# Altium footprint library Roket_Library.PcbLib: 45 footprints (part 2 of 3)
Each footprint in its own frame and in the unit in brackets; x right, y up, seen from the top. Pads: shape width x height; smd on the part's side, far side on the other; paste and mask are expansions set on the pad; w line width, h text height; cw(c..) or ccw(c..) is an arc to the next point about the centre after c.
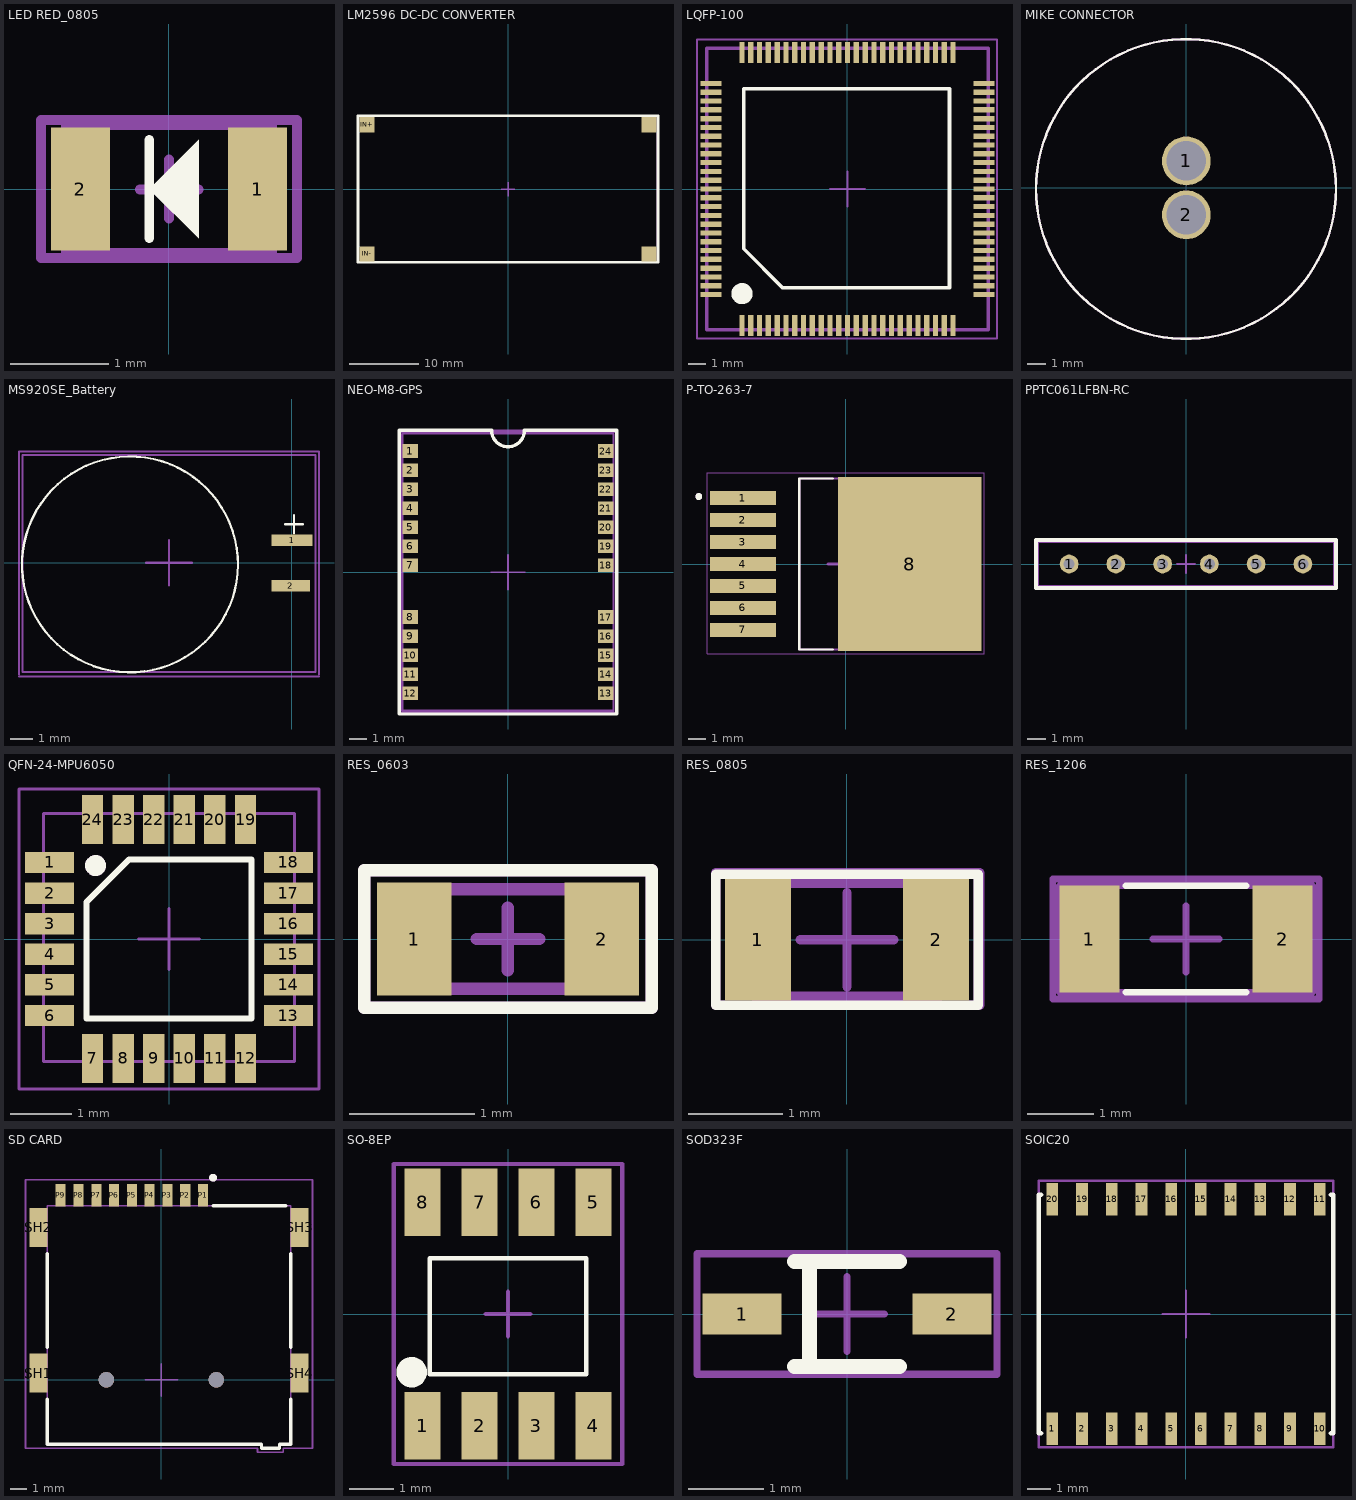
[diagram p1: the footprints below, top view; thin cyan lines are the x and y axes]

## LED RED_0805 [mm]
pads (2):
  rect 0.6x1.25 smd mask+0.05: 1(0.9,0) 2(-0.9,0)
Top Overlay:
  region: 0.3,0.5 0.3,-0.5 -0.2,0
  lines w0.1: -0.2,-0.5 -0.2,0.5
Top 3D Body:
  lines w0.1: -1.05,-0.65 1.05,-0.65 1.05,0.65 -1.05,0.65 -1.05,-0.65
Top Component Center:
  lines w0.1: -0.297,-0.005 0.303,-0.005 ; 0,-0.3 0,0.3 ; -1.3,-0.7 1.3,-0.7 1.3,0.7 -1.3,0.7 -1.3,-0.7
Top Designator:
  lines w0.1: -1.3,-0.7 -1.3,0.7 ; -1.3,-0.7 1.3,-0.7 ; -1.3,-0.7 -1.3,0.7 ; -1.3,-0.7 1.3,-0.7 ; -1.3,0.7 1.3,0.7 ; -1.3,0.7 1.3,0.7 ; 1.3,-0.7 1.3,0.7 ; 1.3,-0.7 1.3,0.7
  text "'.Designator'" at -1.6,-0.8 h0.7
3D body "everlight-17-21-0805LED-red.step": height 1.12, standoff 0.01, extent -1,-0.625 1,0.625

## LM2596 DC-DC CONVERTER [mm]
pads (4):
  rect 2.2x2.2 smd mask+0.05: IN+(-20.3,9.3) IN-(-20.3,-9.3) OUT+(20.3,9.3) OUT-(20.3,-9.3)
Top Overlay:
  lines w0.4: -21.6,-10.5 21.6,-10.5 21.6,10.6 -21.6,10.6 -21.6,-10.5
Top 3D Body:
  lines w0.2: -21.6,-10.5 21.5,-10.5 21.5,10.6 -21.6,10.6 -21.6,-10.5
Top Component Center:
  lines w0.2: -1,0 1,0 ; 0,-1 0,1 ; -21.6,-10.5 21.5,-10.5 21.5,10.6 -21.6,10.6 -21.6,-10.5
Top Designator:
  lines w0.2: -21.6,-10.5 -21.6,10.6 21.5,10.6 21.5,-10.5 -21.6,-10.5
  text "'.Designator'" at -10.8,-1.7 h2
3D body "lm2596.stp": height 13.4, standoff 0.05, extent -21.5,-10.5 21.5,10.5

## LQFP-100 [mm]
pads (100):
  rect 0.3x1.2 smd mask+0.05: 1(-5.995,-7.75) 2(-5.495,-7.75) 3(-4.995,-7.75) 4(-4.495,-7.75) 5(-3.995,-7.75) 6(-3.495,-7.75) 7(-2.995,-7.75) 8(-2.495,-7.75) 9(-1.995,-7.75) 10(-1.495,-7.75) 11(-0.995,-7.75) 12(-0.495,-7.75) 13(0.005,-7.75) 14(0.505,-7.75) 15(1.005,-7.75) 16(1.505,-7.75) 17(2.005,-7.75) 18(2.505,-7.75) 19(3.005,-7.75) 20(3.505,-7.75) 21(4.005,-7.75) 22(4.505,-7.75) 23(5.005,-7.75) 24(5.505,-7.75) 25(6.005,-7.75) 51(6.005,7.75) 52(5.505,7.75) 53(5.005,7.75) 54(4.505,7.75) 55(4.005,7.75) 56(3.505,7.75) 57(3.005,7.75) 58(2.505,7.75) 59(2.005,7.75) 60(1.505,7.75) 61(1.005,7.75) 62(0.505,7.75) 63(0.005,7.75) 64(-0.495,7.75) 65(-0.995,7.75) 66(-1.495,7.75) 67(-1.995,7.75) 68(-2.495,7.75) 69(-2.995,7.75) 70(-3.495,7.75) 71(-3.995,7.75) 72(-4.495,7.75) 73(-4.995,7.75) 74(-5.495,7.75) 75(-5.995,7.75)
  rect 1.2x0.3 smd mask+0.05: 26(7.755,-6) 27(7.755,-5.5) 28(7.755,-5) 29(7.755,-4.5) 30(7.755,-4) 31(7.755,-3.5) 32(7.755,-3) 33(7.755,-2.5) 34(7.755,-2) 35(7.755,-1.5) 36(7.755,-1) 37(7.755,-0.5) 38(7.755,0) 39(7.755,0.5) 40(7.755,1) 41(7.755,1.5) 42(7.755,2) 43(7.755,2.5) 44(7.755,3) 45(7.755,3.5) 46(7.755,4) 47(7.755,4.5) 48(7.755,5) 49(7.755,5.5) 50(7.755,6) 76(-7.755,6) 77(-7.755,5.5) 78(-7.755,5) 79(-7.755,4.5) 80(-7.755,4) 81(-7.755,3.5) 82(-7.755,3) 83(-7.755,2.5) 84(-7.755,2) 85(-7.755,1.5) 86(-7.755,1) 87(-7.755,0.5) 88(-7.755,0) 89(-7.755,-0.5) 90(-7.755,-1) 91(-7.755,-1.5) 92(-7.755,-2) 93(-7.755,-2.5) 94(-7.755,-3) 95(-7.755,-3.5) 96(-7.755,-4) 97(-7.755,-4.5) 98(-7.755,-5) 99(-7.755,-5.5) 100(-7.755,-6)
Top Overlay:
  circle w0.8: c-5.995,-5.95 r0.2
  lines w0.2: -5.9,-3.4 -3.7,-5.6 5.8,-5.6 5.8,5.7 -5.9,5.7 -5.9,-3.4
Top 3D Body:
  lines w0.2: -8,-8 8,-8 8,8 -8,8 -8,-8
Top Component Center:
  lines w0.1: -1,0 1,0 ; 0,-1 0,1 ; -8.55,-8.5 -8.55,6.15 -8.55,8.5 8.5,8.5 8.5,-8.5 -8.55,-8.5
Top Designator:
  lines w0.1: -8.55,-8.5 -8.55,6.15 -8.55,8.5 8.5,8.5 8.5,-8.5 -8.55,-8.5
  text "'.Designator'" at -8.7,-1.8 h2
3D body "STM32F407VGT6.STEP": height 1.6, standoff 0, extent -7.995,-8 8.005,8

## MIKE CONNECTOR [mm]
pads (2):
  round 2.6 hole 2.1 mask+0.05: 1(0,1.438) 2(0,-1.438)
Top Overlay:
  circle w0.127: c-0.017,-0.062 r8
Top 3D Body:
  circle w0.127: c-0.017,-0.062 r8
Top Designator (Mech15):
  circle w0.05: c-0.017,-0.062 r8
3D body "17282-2PG-3ES--3DModel-STEP-1.STEP": height 18.14, standoff -3.14, extent -7.955,-9.054 7.92,9.13

## MS920SE_Battery [mm]
pads (2):
  rect 1.8x0.5 smd mask+0.05: 1(0.013,1)
  rect 1.7x0.5 smd mask+0.05: 2(-0.037,-1)
Top Overlay:
  lines w0.1: -2.604,1.411 ccw(c-7.117,-0.069) -2.6,1.4 ; -0.3,1.7 0.5,1.7 ; 0.1,1.3 0.1,2.1
Top 3D Body:
  lines w0.1: -11.85,-4.8 1.05,-4.8 1.05,4.75 -11.85,4.75 -11.85,-4.8
Top Component Center:
  lines w0.1: -12,-5 1.2,-5 ; -12,-4.9 -12,4.9 1.2,4.9 1.2,-0.5 1.2,-4.9 ; -6.4,0 -4.4,0 ; -5.4,-1 -5.4,1
Top Designator:
  lines w0.1: -12,-5 1.2,-5 ; -12,-4.9 -12,4.9 1.2,4.9 1.2,-0.5 1.2,-4.9
  text "'.Designator'" at -12.5,-1.5 h1.5
3D body "MS920SE-FL27E--3DModel-STEP-56544.STEP": height 2.86, standoff 0.01, extent -11.8,-4.8 1,4.7

## NEO-M8-GPS [mm]
pads (24):
  rect 0.9x0.8 smd mask+0.05: 1(-5.65,7) 2(-5.65,5.9) 3(-5.65,4.8) 4(-5.65,3.7) 5(-5.65,2.6) 6(-5.65,1.5) 7(-5.65,0.4) 8(-5.65,-2.6) 9(-5.65,-3.7) 10(-5.65,-4.8) 11(-5.65,-5.9) 12(-5.65,-7) 13(5.65,-7) 14(5.65,-5.9) 15(5.65,-4.8) 16(5.65,-3.7) 17(5.65,-2.6) 18(5.65,0.4) 19(5.65,1.5) 20(5.65,2.6) 21(5.65,3.7) 22(5.65,4.8) 23(5.65,5.9) 24(5.65,7)
Top Overlay:
  lines w0.2: -6.3,-8.2 6.3,-8.2 6.3,8.2 0.949,8.2 cw(c0,8.2) -0.949,8.2 -6.3,8.2 -6.3,-8.2
Top 3D Body:
  lines w0.1: -6.1,-8 -6.1,8 6.1,8 6.1,-8 -6.1,-8
Top Component Center:
  lines w0.1: -1,0 1,0 ; 0,-1 0,1 ; -6.3,-8.2 -6.3,8.2 6.3,8.2 6.3,-8.2 -6.3,-8.2
Top Designator:
  lines w0.1: -6.2,-8.1 6.3,-8.1 6.3,8.1 -6.2,8.1 -6.2,-8.1
  text "'.Designator'" at -8.2,-1.6 h2
3D body "User Library-NEO-M8Q.step": height 2.39, standoff 0.01, extent -6.1,-8 6.1,8

## P-TO-263-7 [mm]
pads (8):
  rect 3.81x0.8 smd: 1(-5.95,3.81) 2(-5.95,2.54) 3(-5.95,1.27) 4(-5.95,0) 5(-5.95,-1.27) 6(-5.95,-2.54) 7(-5.95,-3.81)
  rect 8.29x10.07 smd paste-4.36: 8(3.71,0)
Top Overlay:
  circle w0.2: c-8.5,3.9 r0.1
  lines w0.127: -0.749,-4.95 -2.69,-4.95 -2.69,4.95 -0.749,4.95
Top Paste:
  region: 1.775,3.365 0.125,3.365 0.125,4.715 1.775,4.715
  region: 1.775,1.345 0.125,1.345 0.125,2.695 1.775,2.695
  region: 1.775,-0.675 0.125,-0.675 0.125,0.675 1.775,0.675
  region: 1.775,-2.695 0.125,-2.695 0.125,-1.345 1.775,-1.345
  region: 1.775,-4.715 0.125,-4.715 0.125,-3.365 1.775,-3.365
  region: 7.295,-4.715 5.645,-4.715 5.645,-3.365 7.295,-3.365
  region: 7.295,-2.695 5.645,-2.695 5.645,-1.345 7.295,-1.345
  region: 7.295,-0.675 5.645,-0.675 5.645,0.675 7.295,0.675
  region: 7.295,1.345 5.645,1.345 5.645,2.695 7.295,2.695
  region: 7.295,3.365 5.645,3.365 5.645,4.715 7.295,4.715
  region: 4.535,-4.715 2.885,-4.715 2.885,-3.365 4.535,-3.365
  region: 4.535,-2.695 2.885,-2.695 2.885,-1.345 4.535,-1.345
  region: 4.535,3.365 2.885,3.365 2.885,4.715 4.535,4.715
  region: 4.535,1.345 2.885,1.345 2.885,2.695 4.535,2.695
Top Component Center:
  lines w0.05: -8,-5.2 -2.94,-5.2 8,-5.2 8,5.29 -2.94,5.29 -8,5.29 -8,-5.2
  lines w0.2: -1,0 1,0 ; 0,-1 0,1
Top Designator:
  lines w0.05: -8,-5.2 -8,5.29 -2.94,5.29 8,5.29 8,-5.2 -2.94,-5.2 -8,-5.2
  text "'.Designator'" at -6.1,-0.9 h1
Mechanical 13:
  circle w0.2: c-8.5,3.9 r0.1
  lines w0.127: -2.69,-4.95 -2.69,4.95 6.71,4.95 6.71,-4.95 -2.69,-4.95
3D body "step_temp.STEP": height 4.4, standoff 0, extent -7.45,-4.95 7.45,4.95

## PPTC061LFBN-RC [mm]
pads (6):
  round 1.02 hole 0.6 mask+0.05: 1(-6.35,0) 2(-3.81,0) 3(-1.27,0) 4(1.27,0) 5(3.81,0) 6(6.35,0)
Top Overlay:
  lines w0.2: -8.15,-1.3 -8.15,1.3 8.15,1.3 8.15,-1.3 -8.15,-1.3
Top 3D Body:
  lines w0.1: -8.05,-1.2 -8.05,1.2 8.05,1.2 8.05,-1.2 -8.05,-1.2
Top Component Center:
  lines w0.1: -0.5,0 0.5,0 ; 0,-0.5 0,0.5 ; -8.1,-1.3 8.1,-1.3 8.1,1.3 -8.1,1.3 -8.1,-1.3
Top Designator:
  lines w0.1: -8.1,-1.3 8.1,-1.3 8.1,1.3 -8.1,1.3 -8.1,-1.3
  text "'.Designator'" at -5.8,-0.9 h1
3D body "HEADER6PFEM.stp": height 8.3, standoff -3.2, extent -8.05,-1.2 8.05,1.2

## QFN-24-MPU6050 [mm]
pads (24):
  rect 0.8x0.35 smd mask+0.05: 1(-1.95,1.25) 2(-1.95,0.75) 3(-1.95,0.25) 4(-1.95,-0.25) 5(-1.95,-0.75) 6(-1.95,-1.25) 13(1.95,-1.25) 14(1.95,-0.75) 15(1.95,-0.25) 16(1.95,0.25) 17(1.95,0.75) 18(1.95,1.25)
  rect 0.35x0.8 smd mask+0.05: 7(-1.25,-1.95) 8(-0.75,-1.95) 9(-0.25,-1.95) 10(0.25,-1.95) 11(0.75,-1.95) 12(1.25,-1.95) 19(1.25,1.95) 20(0.75,1.95) 21(0.25,1.95) 22(-0.25,1.95) 23(-0.75,1.95) 24(-1.25,1.95)
Top Overlay:
  circle w0.2: c-1.2,1.2 r0.071
  lines w0.1: -1.35,-1.3 -1.35,0.6 -0.65,1.3 1.35,1.3 1.35,0 1.35,-1.3 -1.35,-1.3
Top 3D Body:
  circle w0.2: c-1.2,1.2 r0.071
  lines w0.05: -2.05,-2 2.05,-2 2.05,2.05 -2.05,2.05 -2.05,-2
Top Component Center:
  lines w0.05: -0.5,0 0.5,0 ; 0,-0.5 0,0.5 ; -2.45,-2.45 2.45,-2.45 2.45,2.45 -2.45,2.45 -2.45,-2.45
Top Designator:
  lines w0.05: -2.45,-2.45 -2.45,2.45 2.45,2.45 2.45,-2.45 -2.45,-2.45
  text "'.Designator'" at -2.05,-0.45 h0.5
3D body "User Library-mpu-6050_qfn-24.step": height 0.91, standoff 0.01, extent -2.02,-2 2.02,2.04

## RES_0603 [mm]
pads (2):
  rect 0.6x0.9 smd mask+0.05: 1(-0.75,0) 2(0.75,0)
Top Overlay:
  lines w0.1: -1.15,-0.55 1.15,-0.55 1.15,0.55 -1.15,0.55 -1.15,-0.55
Top 3D Body:
  lines w0.1: -0.8,-0.4 -0.8,0.4 0.8,0.4 0.8,-0.4 -0.8,-0.4
Top Component Center:
  lines w0.1: -0.25,0 0.25,0 ; 0,-0.25 0,0.25 ; -1.15,-0.55 -1.15,0.55 1.15,0.55 1.15,-0.55 -1.15,-0.55
Top Designator:
  lines w0.1: -1.15,-0.55 1.15,-0.55 1.15,0.55 -1.15,0.55 -1.15,-0.55
  text "'.Designator'" at -1.15,-0.55 h0.5
3D body "RESC0603 v2.step": height 0.45, standoff 0, extent -0.8,-0.4 0.8,0.4

## RES_0805 [mm]
pads (2):
  rect 0.7x1.3 smd mask+0.05: 1(-0.95,0) 2(0.95,0)
Top Overlay:
  lines w0.1: -1.4,-0.7 1.4,-0.7 1.4,0.7 -1.4,0.7 -1.4,-0.7
Top 3D Body:
  lines w0.1: -1,-0.6 1,-0.6 1,0.6 -1,0.6 -1,-0.6
Top Component Center:
  lines w0.1: -0.5,0 0.5,0 ; 0,-0.5 0,0.5 ; -1.4,-0.7 1.416,-0.7 1.416,0.716 -1.4,0.716 -1.4,-0.7
Top Designator:
  lines w0.1: -1.4,-0.7 -1.4,0.7 1.4,0.7 1.4,-0.7 -1.4,-0.7
  text "'.Designator'" at -1.4,-0.4 h0.5
3D body "RESC0805 v1.step": height 0.45, standoff 0, extent -1,-0.6 1,0.6

## RES_1206 [mm]
pads (2):
  rect 0.9x1.6 smd mask+0.05: 1(-1.45,0) 2(1.45,0)
Top Overlay:
  lines w0.1: -0.9,-0.8 0.9,-0.8 ; -0.9,0.8 0.9,0.8
Top 3D Body:
  lines w0.1: -1.6,-0.8 1.6,-0.8 1.6,0.8 -1.6,0.8 -1.6,-0.8
Top Component Center:
  lines w0.1: -0.5,0 0.5,0 ; 0,-0.5 0,0.5 ; -2,-0.9 -2,0.9 2,0.9 2,-0.9 -2,-0.9
Top Designator:
  lines w0.1: -1.9,-0.8 1.9,-0.8 1.9,0.8 -1.9,0.8 -1.9,-0.8
  text "'.Designator'" at -2,-0.5 h0.5
3D body "RESC1206 v1.step": height 0.55, standoff 0, extent -1.6,-0.8 1.6,0.8

## SD CARD [mm]
pads (15):
  rect 0.62x1.4 smd mask+0.05: P1(2.58,11.42) P2(1.48,11.42) P3(0.38,11.42) P4(-0.72,11.42) P5(-1.82,11.42) P6(-2.92,11.42) P7(-4.02,11.42) P8(-5.12,11.42) P9(-6.22,11.42)
  rect 1.1x2.4 smd mask+0.05: SH1(-7.6,0.42) SH2(-7.6,9.42) SH3(8.55,9.42) SH4(8.55,0.42)
  round 0.95 hole 0.95 unplated: ""(-3.4,0) ""(3.4,0)
Top Overlay:
  circle w0.24: c3.2,12.5 r0.12
  lines w0.2: -7.05,-1.2 -7.05,-3.98 6.2,-3.98 6.2,-4.23 7.3,-4.23 7.3,-3.98 8,-3.98 8,-1.2 ; -7.05,2 -7.05,7.8 ; 3.2,10.77 7.7,10.77 ; 8,2 8,7.8
Top Component Center:
  lines w0.1: -1,0 1,0 ; 0,-1 0,1 ; -8.4,-4.23 -8.4,12.37 9.35,12.37 9.35,-4.23 7.55,-4.23 7.55,-4.48 5.95,-4.48 5.95,-4.23 -8.4,-4.23
Top Designator:
  lines w0.1: -8.4,-4.23 -8.4,12.37 9.35,12.37 9.35,-4.23 7.55,-4.23 7.55,-4.48 5.95,-4.48 5.95,-4.23 -8.4,-4.23
  text "'.Designator'" at -3.2,-0.5 h0.6
Mechanical 13:
  circle w0.24: c3.2,12.5 r0.12
  lines w0.1: -7.05,-3.98 6.2,-3.98 6.2,-4.23 7.3,-4.23 7.3,-3.98 8,-3.98 8,10.77 -7.05,10.77 -7.05,-3.98
3D body "MEM2075-00-140-01-A--3DModel-STEP-56544.STEP": height 1.46, standoff -0.59, extent -7.74,-3.869 8.7,11.981

## SO-8EP [mm]
pads (8):
  rect 0.802x1.505 smd mask+0.05: 1(-1.905,-2.497) 2(-0.635,-2.497) 3(0.635,-2.497) 4(1.905,-2.497) 5(1.905,2.498) 6(0.635,2.498) 7(-0.635,2.498) 8(-1.905,2.498)
Top Overlay:
  circle w0.4: c-2.15,-1.3 r0.14
  lines w0.1: -1.75,-1.35 1.75,-1.35 1.75,1.25 -1.75,1.25 -1.75,-1.35
Top Component Center:
  lines w0.1: -0.5,0 0.5,0 ; 0,-0.5 0,0.5 ; -2.55,-3.35 -2.55,3.35 2.55,3.35 2.55,-3.35 -2.55,-3.35
Top Designator:
  lines w0.1: -2.55,-3.35 -2.55,3.35 2.55,3.35 2.55,-3.35 -2.55,-3.35
  text "'.Designator'" at -3.1,-0.6 h0.6
3D body "SOIC8_ZXBM5210-SP-13_DIO.step": height 1.5, standoff 0, extent -2.481,-3.047 2.471,3.053

## SOD323F [mm]
pads (2):
  rect 1.05x0.55 smd mask+0.05: 1(-1.4,0) 2(1.4,0)
Top Overlay:
  lines w0.2: -0.7,-0.7 0.7,-0.7 ; -0.7,0.7 0.7,0.7 ; -0.5,-0.7 -0.5,0.7
Top Component Center:
  lines w0.1: -0.5,0 0.5,0 ; 0,-0.5 0,0.5 ; -2,-0.8 -2,0.4 -2,0.8 2,0.8 2,-0.8 -2,-0.8
Top Designator:
  lines w0.1: -2,-0.8 2,-0.8 2,0.8 -2,0.8 -2,0.4 -2,-0.8
  text "'.Designator'" at -2.5,-0.5 h0.5
3D body "User Library-SOD323F-1.step": height 1.01, standoff 0.01, extent -1.25,-0.675 1.25,0.675

## SOIC20 [mm]
pads (20):
  rect 0.5x1.4 smd mask+0.05: 1(-5.715,-4.902) 2(-4.445,-4.902) 3(-3.175,-4.902) 4(-1.905,-4.902) 5(-0.635,-4.902) 6(0.635,-4.902) 7(1.905,-4.902) 8(3.175,-4.902) 9(4.445,-4.902) 10(5.715,-4.902) 11(5.715,4.902) 12(4.445,4.902) 13(3.175,4.902) 14(1.905,4.902) 15(0.635,4.902) 16(-0.635,4.902) 17(-1.905,4.902) 18(-3.175,4.902) 19(-4.445,4.902) 20(-5.715,4.902)
Top Overlay:
  lines w0.2: -6.2,-5.1 -6.3,-5.1 -6.3,5.1 -6.2,5.1 ; 6.2,-5.1 6.3,-5.1 6.3,5.1 6.2,5.1
Top 3D Body:
  lines w0.1: -6.2,-5.1 -6.3,-5.1 -6.3,5.1 -6.2,5.1 ; 6.2,-5.1 6.3,-5.1 6.3,5.1 6.2,5.1
Top Component Center:
  lines w0.1: -1,0 1,0 ; 0,-1 0,1 ; -6.3,-5.7 6.3,-5.7 6.3,5.7 -6.3,5.7 -6.3,-5.7
Top Designator:
  lines w0.1: -6.3,-5.7 6.3,-5.7 6.3,5.7 -6.3,5.7 -6.3,-5.7
  text "'.Designator'" at -5.8,-0.7 h1
3D body "User Library-SOIC20.step": height 2.21, standoff -0.02, extent -6.3,-5.067 6.3,5.067